# Altium footprint library RL1.PCBLIB: 94 footprints (part 3 of 6)
Each footprint in its own frame and in the unit in brackets; x right, y up, seen from the top. Pads: shape width x height; smd on the part's side, far side on the other; paste and mask are expansions set on the pad; w line width, h text height; cw(c..) or ccw(c..) is an arc to the next point about the centre after c.
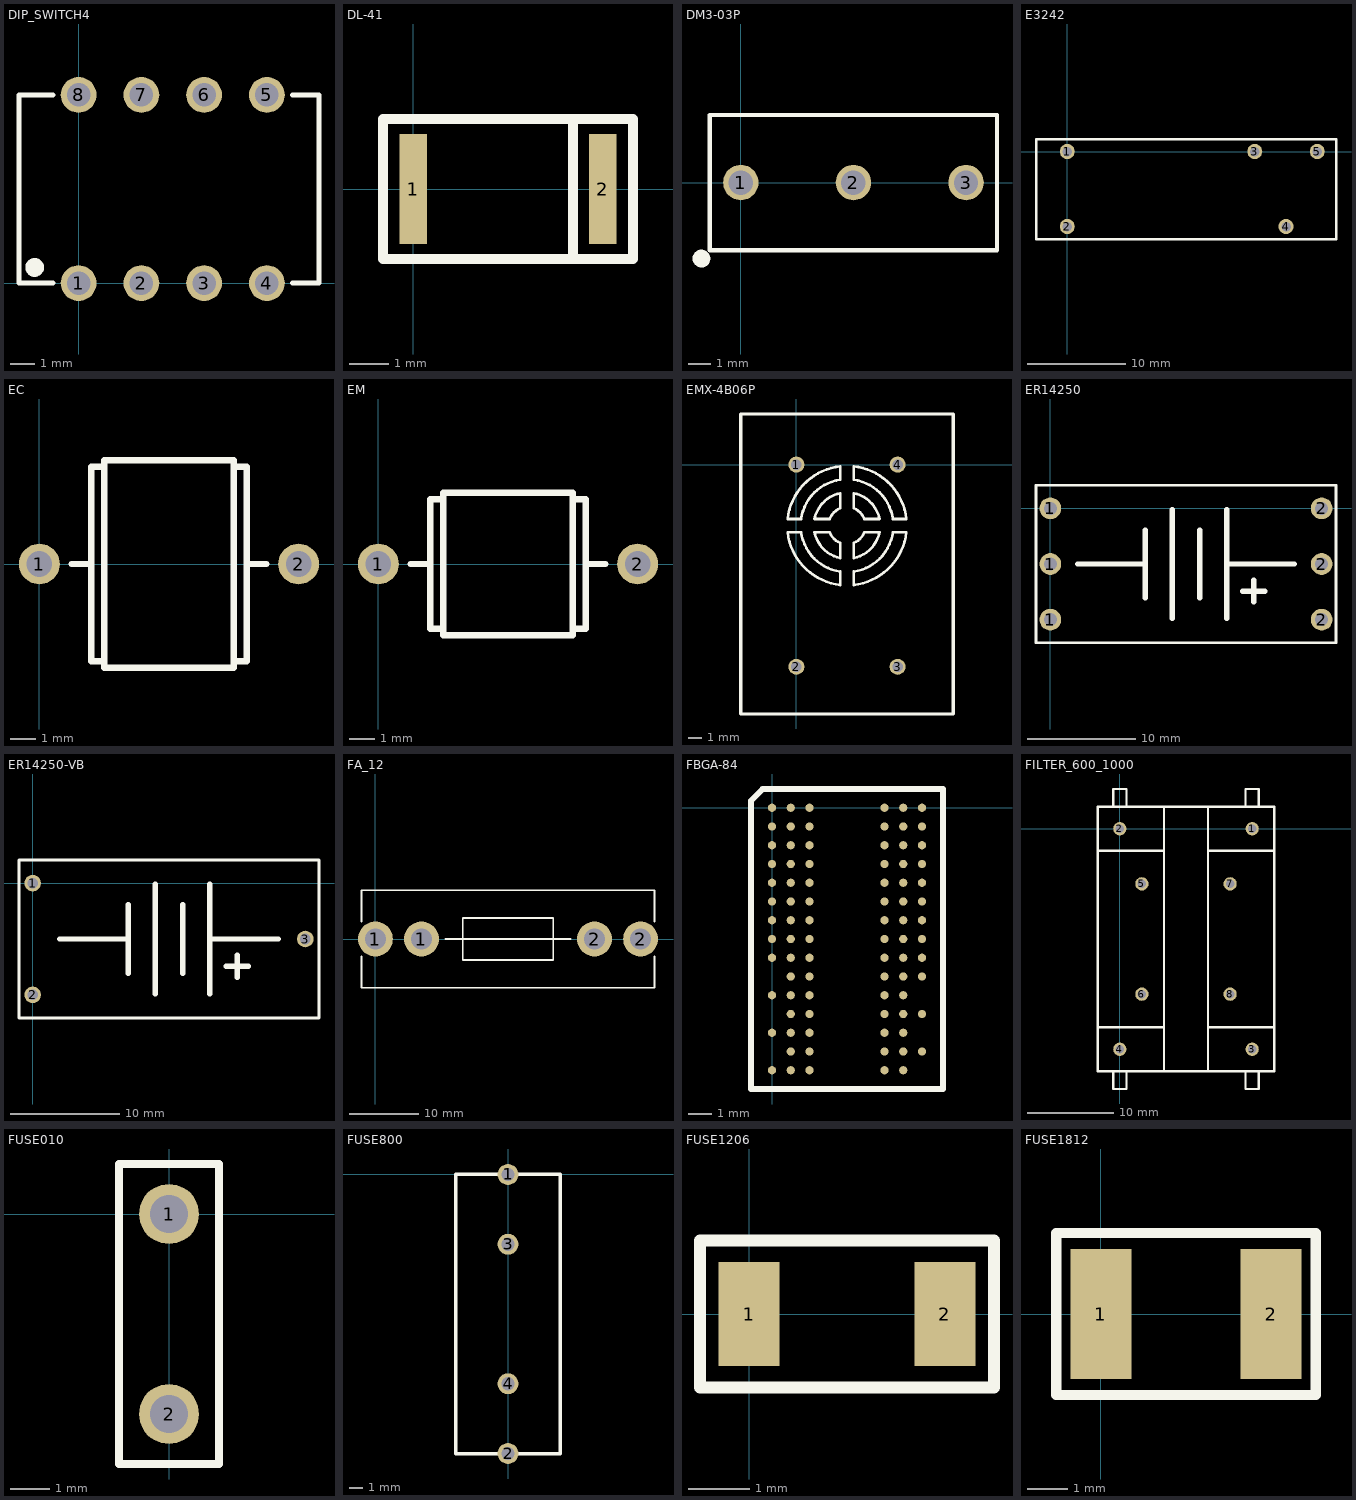
[diagram p2: the footprints below, top view; thin cyan lines are the x and y axes]

## DIP_SWITCH4 [mm]
pads (8):
  round 1.45 hole 0.95: 1(0,0) 2(2.54,0) 3(5.08,0) 4(7.62,0) 5(7.62,7.62) 6(5.08,7.62) 7(2.54,7.62) 8(0,7.62)
Top Overlay:
  circle w0.4: c-1.78,0.635 r0.18
  lines w0.2: -1.041,0 -2.413,0 -2.413,7.62 -1.041,7.62 ; 8.661,0 9.728,0 9.728,7.62 8.661,7.62
Top Assembly:
  text ".Designator" at 8.656,3.477 h1
3D body "c-1825057-3-o-3d.stp": height 5.49, standoff -2.87, extent -2.413,-0.381 9.728,7.999

## DL-41 [mm]
pads (2):
  rect 0.7x2.8 smd: 1(0,0) 2(4.826,0)
Top Overlay:
  lines w0.254: 4.064,-1.778 4.064,1.778 ; -0.762,-1.778 5.588,-1.778 5.588,1.778 -0.762,1.778 -0.762,-1.778
Top Assembly:
  text ".Designator" at 7.411,-0.333 h1

## DM3-03P [mm]
pads (3):
  round 1.6 hole 1.1: 1(0,0) 2(5.08,0) 3(10.16,0)
Top Overlay:
  circle w0.4: c-1.778,-3.429 r0.2
  lines w0.2: -1.397,-3.048 -1.397,3.048 11.557,3.048 11.557,-3.048 -1.397,-3.048
Top Assembly:
  text ".Designator" at 9.738,-0.674 h1

## E3242 [mil]
pads (5):
  round 60 hole 38: 1(0,0) 2(0,-300) 3(750,0) 4(875,-300) 5(1000,0)
Top Overlay:
  lines w10: -125,-350 1075,-350 1075,50 -125,50 -125,-350
Top Assembly:
  text ".Designator" at 671.79,-163.12 h39.37

## EC [mm]
pads (2):
  round 1.6 hole 1: 1(0,0) 2(10.16,0)
Top Overlay:
  lines w0.254: 1.27,0 2.032,0 ; 2.54,-3.81 2.032,-3.81 2.032,3.81 2.54,3.81 ; 7.62,-3.81 8.128,-3.81 8.128,3.81 7.62,3.81 ; 8.128,0 8.89,0 ; 2.54,-4.064 7.62,-4.064 7.62,4.064 2.54,4.064 2.54,-4.064
Top Assembly:
  text ".Designator" at 10.078,-0.333 h1
3D body "User Library-EC75X.STEP": height 8.3, standoff 0.1, extent 2.135,-4.095 8.035,4.105

## EM [mm]
pads (2):
  round 1.6 hole 1: 1(0,0) 2(10.16,0)
Top Overlay:
  lines w0.254: 1.27,0 2.032,0 ; 2.54,-2.54 2.032,-2.54 2.032,2.54 2.54,2.54 ; 7.62,-2.54 8.128,-2.54 8.128,2.54 7.62,2.54 ; 8.128,0 8.89,0 ; 2.54,-2.794 7.62,-2.794 7.62,2.794 2.54,2.794 2.54,-2.794
Top Assembly:
  text ".Designator" at 10.078,-0.333 h1

## EMX-4B06P [mm]
pads (4):
  round 1.2 hole 0.8: 1(0,0) 2(0,-15.24) 3(7.62,-15.24) 4(7.62,0)
Top Overlay:
  lines w0.2: -0.662,-5.102 ccw(c3.81,-4.6) 3.308,-9.072 ; -0.662,-4.098 cw(c3.81,-4.6) 3.308,-0.128 ; -0.66,-5.1 0.35,-5.1 ; -0.66,-4.1 0.35,-4.1 ; 0.346,-5.099 ccw(c3.81,-4.6) 3.311,-8.064 ; 0.346,-4.101 cw(c3.81,-4.6) 3.311,-1.136 ; 1.36,-5.1 2.5,-5.1 ; 1.36,-5.098 ccw(c3.81,-4.6) 3.312,-7.05 ; 1.36,-4.102 cw(c3.81,-4.6) 3.312,-2.15 ; 1.36,-4.1 2.5,-4.1 ; 2.502,-5.099 ccw(c3.81,-4.6) 3.311,-5.908 ; 2.502,-4.101 cw(c3.81,-4.6) 3.311,-3.292 ; 3.31,-9.07 3.31,-8.06 ; 3.31,-7.05 3.31,-5.91 ; 3.31,-3.29 3.31,-2.15 ; 3.31,-1.14 3.31,-0.13 ; 4.308,-7.05 ccw(c3.81,-4.6) 6.26,-5.098 ; 4.308,-2.15 cw(c3.81,-4.6) 6.26,-4.102 ; 4.309,-8.064 ccw(c3.81,-4.6) 7.274,-5.099 ; 4.309,-5.908 ccw(c3.81,-4.6) 5.118,-5.099 ; 4.309,-3.292 cw(c3.81,-4.6) 5.118,-4.101 ; 4.309,-1.136 cw(c3.81,-4.6) 7.274,-4.101 ; 4.31,-9.07 4.31,-8.06 ; 4.31,-7.05 4.31,-5.91 ; 4.31,-3.29 4.31,-2.15 ; 4.31,-1.14 4.31,-0.13 ; 4.312,-9.072 ccw(c3.81,-4.6) 8.282,-5.102 ; 4.312,-0.128 cw(c3.81,-4.6) 8.282,-4.098 ; 5.12,-5.1 6.26,-5.1 ; 5.12,-4.1 6.26,-4.1 ; 7.27,-5.1 8.28,-5.1 ; 7.27,-4.1 8.28,-4.1
  lines w0.254: -4.191,-18.796 11.811,-18.796 11.811,3.81 -4.191,3.81 -4.191,-18.796
Top Assembly:
  text ".Designator" at 8.808,-7.826 h1

## ER14250 [mm]
pads (6):
  round 2 hole 1.2: 1(0,-10.25) 1(0,-5.125) 1(0,0) 2(25,-10.25) 2(25,-5.125) 2(25,0)
Top Overlay:
  lines w0.254: -1.325,-12.375 26.325,-12.375 26.325,2.125 -1.325,2.125 -1.325,-12.375
  lines w0.5: 2.5,-5.125 8.75,-5.125 ; 8.75,-8.25 8.75,-2 ; 11.25,-10.125 11.25,-0.125 ; 13.75,-8.25 13.75,-2 ; 16.25,-10.125 16.25,-0.125 ; 16.25,-5.125 22.5,-5.125 ; 17.75,-7.625 19.75,-7.625 ; 18.75,-8.625 18.75,-6.625
Top Assembly:
  text ".Designator" at 17.498,-5.458 h1
3D body "User Library-BR-1_2AAE5P.STEP": height 15.7, standoff -3.24, extent -0.51,-12.386 25.49,2.115

## ER14250-VB [mil]
pads (3):
  round 60 hole 38: 1(0,0) 2(0,-403.54) 3(984.25,-201.77)
Top Overlay:
  lines w10: -49.21,-487.2 1033.46,-487.2 1033.46,83.66 -49.21,83.66 -49.21,-487.2
  lines w19.68: 98.43,-201.77 344.49,-201.77 ; 344.49,-324.8 344.49,-78.74 ; 442.91,-398.62 442.91,-4.92 ; 541.34,-324.8 541.34,-78.74 ; 639.76,-398.62 639.76,-4.92 ; 639.76,-201.77 885.83,-201.77 ; 698.82,-300.2 777.56,-300.2 ; 738.19,-339.57 738.19,-260.83
Top Assembly:
  text ".Designator" at 688.91,-214.89 h39.37

## FA_12 [mm]
pads (4):
  round 5 hole 3: 1(0,0) 1(6.6,0) 2(31.4,0) 2(38,0)
Top Overlay:
  lines w0.254: 10,0 28,0 ; 40,2.5 40,7 ; -2,-2.5 -2,-7 40,-7 40,-2.5 ; -2,-2.5 -2,-2.5 ; -2,2.5 -2,7 40,7 ; -2,2.5 -2,2.5 ; 40,-2.5 40,-2.5 ; 40,7 40,7 ; 12.5,-3 12.5,3 25.5,3 25.5,-3 12.5,-3
Top Assembly:
  text ".Designator" at 23.998,-0.333 h1
3D body "SW3dPS-Fuse Clip.STEP": height 10.47, standoff -3.05, extent -0.664,-3.8 7.464,3.849
3D body "SW3dPS-Fuse Clip.STEP": height 10.47, standoff -3.05, extent 30.736,-3.8 38.864,3.849

## FBGA-84 [mm]
pads (84):
  round 0.35 smd: A1(0,0) A2(0.8,0) A3(1.6,0) A7(4.8,0) A8(5.6,0) A9(6.4,0) B1(0,-0.8) B2(0.8,-0.8) B3(1.6,-0.8) B7(4.8,-0.8) B8(5.6,-0.8) B9(6.4,-0.8) C1(0,-1.6) C2(0.8,-1.6) C3(1.6,-1.6) C7(4.8,-1.6) C8(5.6,-1.6) C9(6.4,-1.6) D1(0,-2.4) D2(0.8,-2.4) D3(1.6,-2.4) D7(4.8,-2.4) D8(5.6,-2.4) D9(6.4,-2.4) E1(0,-3.2) E2(0.8,-3.2) E3(1.6,-3.2) E7(4.8,-3.2) E8(5.6,-3.2) E9(6.4,-3.2) F1(0,-4) F2(0.8,-4) F3(1.6,-4) F7(4.8,-4) F8(5.6,-4) F9(6.4,-4) G1(0,-4.8) G2(0.8,-4.8) G3(1.6,-4.8) G7(4.8,-4.8) G8(5.6,-4.8) G9(6.4,-4.8) H1(0,-5.6) H2(0.8,-5.6) H3(1.6,-5.6) H7(4.8,-5.6) H8(5.6,-5.6) H9(6.4,-5.6) J1(0,-6.4) J2(0.8,-6.4) J3(1.6,-6.4) J7(4.8,-6.4) J8(5.6,-6.4) J9(6.4,-6.4) K2(0.8,-7.2) K3(1.6,-7.2) K7(4.8,-7.2) K8(5.6,-7.2) K9(6.4,-7.2) L1(0,-8) L2(0.8,-8) L3(1.6,-8) L7(4.8,-8) L8(5.6,-8) M2(0.8,-8.8) M3(1.6,-8.8) M7(4.8,-8.8) M8(5.6,-8.8) M9(6.4,-8.8) N1(0,-9.6) N2(0.8,-9.6) N3(1.6,-9.6) N7(4.8,-9.6) N8(5.6,-9.6) P2(0.8,-10.4) P3(1.6,-10.4) P7(4.8,-10.4) P8(5.6,-10.4) P9(6.4,-10.4) R1(0,-11.2) R2(0.8,-11.2) R3(1.6,-11.2) R7(4.8,-11.2) R8(5.6,-11.2)
Top Overlay:
  lines w0.25: -0.9,-12 7.3,-12 7.3,0.8 -0.4,0.8 -0.9,0.3 -0.9,-12
Top Assembly:
  text ".Designator" at 8.198,-5.933 h1
3D body "User Library-BGA84_8M0X12M5.STEP": height 1.11, standoff 0, extent -0.8,-11.85 7.2,0.65

## FILTER_600_1000 [mil]
pads (8):
  round 60 hole 38: 1(600,0) 2(0,0) 3(600,-1000) 4(0,-1000) 5(100,-250) 6(100,-750) 7(500,-250) 8(500,-750)
Top Overlay:
  lines w10: -100,-900 200,-900 ; -100,-100 200,-100 ; -30,-1100 -30,-1180 30,-1180 30,-1100 ; -30,100 -30,180 30,180 30,100 ; 200,-1100 200,100 ; 400,-1100 400,100 ; 400,-900 700,-900 ; 400,-100 700,-100 ; 570,-1100 570,-1180 630,-1180 630,-1100 ; 570,100 570,180 630,180 630,100 ; -100,-1100 700,-1100 700,100 -100,100 -100,-1100
Top Assembly:
  text ".Designator" at 496.79,-513.12 h39.37

## FUSE010 [mil]
pads (2):
  round 60 hole 38: 1(0,0) 2(0,-200)
Top Overlay:
  lines w7.87: -50,-250 -50,50 50,50 50,-250 -50,-250
Top Assembly:
  text ".Designator" at 196.79,-113.12 h39.37

## FUSE800 [mil]
pads (4):
  round 60 hole 38: 1(0,0) 2(0,-800) 3(0,-200) 4(0,-600)
Top Overlay:
  lines w10: -150,-800 -150,0 150,0 150,-800 -150,-800
Top Assembly:
  text ".Designator" at 196.79,-413.12 h39.37

## FUSE1206 [mm]
pads (2):
  rect 1x1.7 smd: 1(0,0) 2(3.2,0)
Top Overlay:
  lines w0.2: -0.8,-1.2 4,-1.2 4,1.2 -0.8,1.2 -0.8,-1.2
Top Assembly:
  text ".Designator" at -2.299,-0.267 h0.8
3D body "SW3dPS-smt_resistor_packages1206.STEP": height 0.61, standoff -0.01, extent -0.015,-0.805 3.205,0.815

## FUSE1812 [mm]
pads (2):
  rect 1.5x3.2 smd: 1(0,0) 2(4.2,0)
Top Overlay:
  lines w0.254: -1.1,-2 -1.1,2 5.3,2 5.3,-2 -1.1,-2
Top Assembly:
  text ".Designator" at -2.898,-0.333 h1
3D body "User Library-fuse1812.STEP": height 1.32, standoff 0, extent -0.31,-1.61 4.51,1.61